# Altium footprint library ThanhNT.PcbLib: 579 footprints (part 27 of 37)
Each footprint in its own frame and in the unit in brackets; x right, y up, seen from the top. Pads: shape width x height; smd on the part's side, far side on the other; paste and mask are expansions set on the pad; w line width, h text height; cw(c..) or ccw(c..) is an arc to the next point about the centre after c.
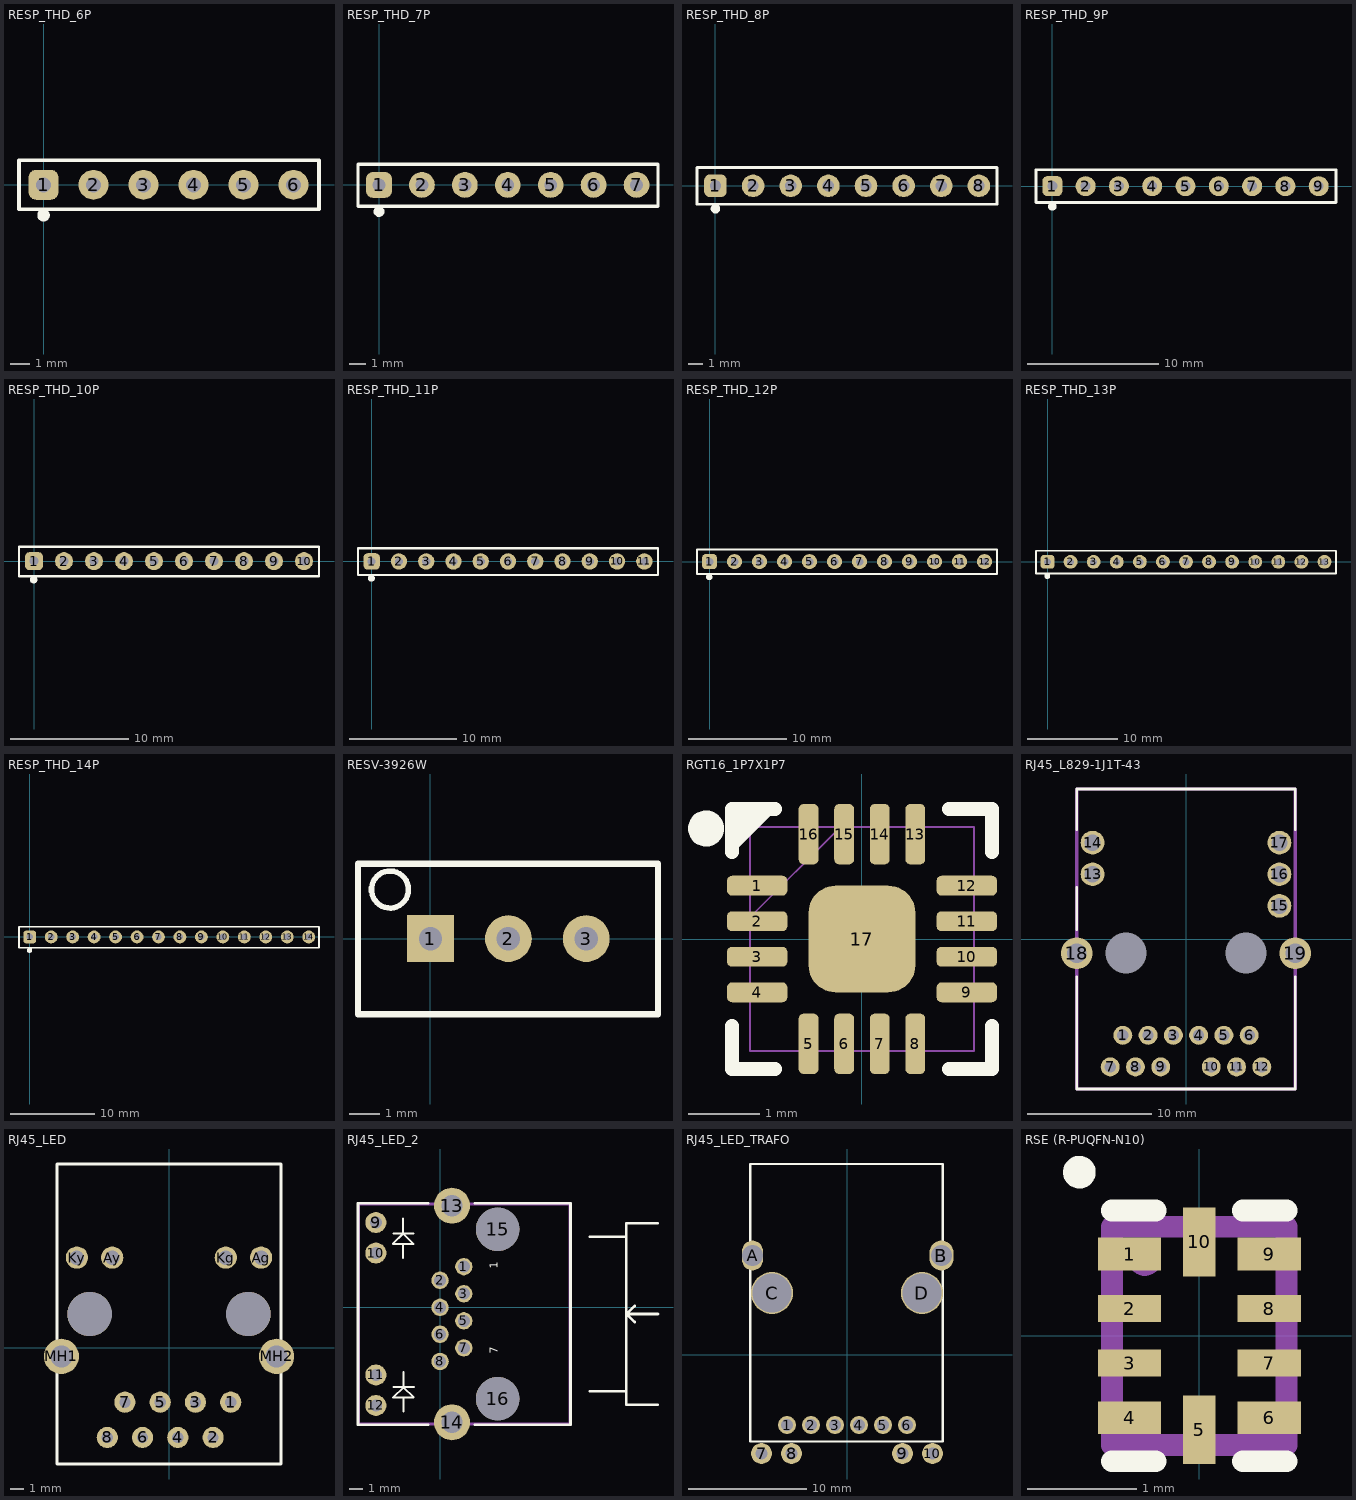
[diagram p26: the footprints below, top view; thin cyan lines are the x and y axes]

## RESP_THD_6P [mil]
pads (6):
  rrect50% 60x60 hole 30: 1(0,0)
  round 60 hole 30: 2(100,0) 3(200,0) 4(300,0) 5(400,0) 6(500,0)
Top Overlay:
  circle w15: c0,-61 r5
  lines w7.87: -49,-49 551,-49 551,49 -49,49 -49,-49
3D body "User Library-4600X Series (Bourns)4606X.STEP": height 206.75, standoff -123.31, extent -49,-52.64 549.03,45.39

## RESP_THD_7P [mil]
pads (7):
  rrect50% 60x60 hole 30: 1(0,0)
  round 60 hole 30: 2(100,0) 3(200,0) 4(300,0) 5(400,0) 6(500,0) 7(600,0)
Top Overlay:
  circle w15: c0,-62 r5
  lines w7.87: -49,-50 650,-50 650,48 -49,48 -49,-50
3D body "User Library-4600X Series (Bourns)4607X.STEP": height 206.75, standoff -123.31, extent -48,-51.64 650.04,46.39

## RESP_THD_8P [mil]
pads (8):
  rrect50% 60x60 hole 30: 1(0,0)
  round 60 hole 30: 2(100,0) 3(200,0) 4(300,0) 5(400,0) 6(500,0) 7(600,0) 8(700,0)
Top Overlay:
  circle w15: c0,-61 r5
  lines w7.87: -49,-49 -49,49 748,49 748,-49 -49,-49
3D body "User Library-4600X Series (Bourns)4608X.STEP": height 206.75, standoff -123.31, extent -49,-51.64 749.04,46.39

## RESP_THD_9P [mil]
pads (9):
  rrect50% 60x60 hole 30: 1(0,0)
  round 60 hole 30: 2(100,0) 3(200,0) 4(300,0) 5(400,0) 6(500,0) 7(600,0) 8(700,0) 9(800,0)
Top Overlay:
  circle w15: c0,-61 r5
  lines w7.87: -49,-49 -49,49 852,49 852,-49 -49,-49
3D body "User Library-4600X Series (Bourns)4609X.STEP": height 206.75, standoff -123.31, extent -49,-50.64 849.04,47.39

## RESP_THD_10P [mil]
pads (10):
  rrect50% 60x60 hole 30: 1(0,0)
  round 60 hole 30: 2(100,0) 3(200,0) 4(300,0) 5(400,0) 6(500,0) 7(600,0) 8(700,0) 9(800,0) 10(900,0)
Top Overlay:
  circle w15: c-1,-62 r5
  lines w7.87: -50,-50 950,-50 950,48 -50,48 -50,-50
3D body "User Library-4600X Series (Bourns)4610X.STEP": height 206.75, standoff -123.31, extent -49,-50.64 949.04,47.39

## RESP_THD_11P [mil]
pads (11):
  rrect50% 60x60 hole 30: 1(0,0)
  round 60 hole 30: 2(100,0) 3(200,0) 4(300,0) 5(400,0) 6(500,0) 7(600,0) 8(700,0) 9(800,0) 10(900,0) 11(1000,0)
Top Overlay:
  circle w15: c-1,-62 r5
  lines w7.87: -50,-50 1050,-50 1050,48 -50,48 -50,-50
3D body "User Library-4600X Series (Bourns)4611X.STEP": height 206.75, standoff -123.31, extent -50,-48.02 1048.03,50.02

## RESP_THD_12P [mil]
pads (12):
  rrect50% 60x60 hole 30: 1(0,0)
  round 60 hole 30: 2(100,0) 3(200,0) 4(300,0) 5(400,0) 6(500,0) 7(600,0) 8(700,0) 9(800,0) 10(900,0) 11(1000,0) 12(1100,0)
Top Overlay:
  circle w15: c-1,-62 r5
  lines w7.87: -50,-50 -50,48 1150,48 1150,-50 -50,-50
3D body "User Library-4600X Series (Bourns)4612X.STEP": height 206.75, standoff -123.31, extent -50.02,-48 1148.02,50.03

## RESP_THD_13P [mil]
pads (13):
  rrect50% 60x60 hole 30: 1(0,0)
  round 60 hole 30: 2(100,0) 3(200,0) 4(300,0) 5(400,0) 6(500,0) 7(600,0) 8(700,0) 9(800,0) 10(900,0) 11(1000,0) 12(1100,0) 13(1200,0)
Top Overlay:
  circle w15: c-1,-62 r5
  lines w7.87: -50,-50 1250,-50 1250,48 -50,48 -50,-50
3D body "User Library-4600X Series (Bourns)4613X.STEP": height 206.75, standoff -123.31, extent -50.02,-50.03 1248.02,48

## RESP_THD_14P [mil]
pads (14):
  rrect50% 60x60 hole 30: 1(0,0)
  round 60 hole 30: 2(100,0) 3(200,0) 4(300,0) 5(400,0) 6(500,0) 7(600,0) 8(700,0) 9(800,0) 10(900,0) 11(1000,0) 12(1100,0) 13(1200,0) 14(1300,0)
Top Overlay:
  circle w15: c-1,-62 r5
  lines w7.87: -50,-50 -50,48 1348,48 1348,-50 -50,-50
3D body "User Library-4600X Series (Bourns)4614X.STEP": height 206.75, standoff -123.31, extent -49.02,-48 1349.02,50.03

## RESV-3926W [mil]
pads (3):
  rect 60x60 hole 30: 1(0,0)
  round 60 hole 30: 2(100,0) 3(200,0)
Top Overlay:
  circle w7.09: c-52,63 r23.77
  lines w7.87: -93,-97 -93,96 292,96 292,-97 -93,-97
3D body "User Library-67W.STEP": height 474.91, standoff -165.64, extent -92.91,-99.44 292.91,95.44

## RGT16_1P7X1P7 [mm]
pads (17):
  rrect50% 0.85x0.28 smd: 1(-1.475,0.75) 2(-1.475,0.25) 3(-1.475,-0.25) 4(-1.475,-0.75) 9(1.475,-0.75) 10(1.475,-0.25) 11(1.475,0.25) 12(1.475,0.75)
  rrect50% 0.28x0.85 smd: 5(-0.75,-1.475) 6(-0.25,-1.475) 7(0.25,-1.475) 8(0.75,-1.475) 13(0.75,1.475) 14(0.25,1.475) 15(-0.25,1.475) 16(-0.75,1.475)
  rrect50% 1.5x1.5 smd: 17(0,0)
Top Overlay:
  circle w0.254: c-2.194,1.555 r0.127
  region: -1.854,1.803 -1.219,1.803 -1.854,1.168
  lines w0.2: -1.829,-1.223 -1.829,-1.829 -1.223,-1.829 ; -1.829,1.223 -1.829,1.829 -1.223,1.829 ; 1.223,-1.829 1.829,-1.829 1.829,-1.223 ; 1.223,1.829 1.829,1.829 1.829,1.223
Mechanical 1:
  lines w0.025: -1.575,0.305 -0.305,1.575 ; -1.575,-1.575 -1.575,1.575 1.575,1.575 1.575,-1.575 -1.575,-1.575 ; -1.575,-0.9 -1.575,-0.6 -1.575,-0.9 ; -1.575,-0.4 -1.575,-0.1 -1.575,-0.4 ; -1.575,0.1 -1.575,0.4 -1.575,0.1 ; -1.575,0.6 -1.575,0.9 -1.575,0.6 ; -0.9,-1.575 -0.6,-1.575 -0.9,-1.575 ; -0.9,1.575 -0.6,1.575 -0.9,1.575 ; -0.4,-1.575 -0.1,-1.575 -0.4,-1.575 ; -0.4,1.575 -0.1,1.575 -0.4,1.575 ; 0.1,-1.575 0.4,-1.575 0.1,-1.575 ; 0.1,1.575 0.4,1.575 0.1,1.575 ; 0.6,-1.575 0.9,-1.575 0.6,-1.575 ; 0.6,1.575 0.9,1.575 0.6,1.575 ; 1.575,-0.9 1.575,-0.6 1.575,-0.9 ; 1.575,-0.4 1.575,-0.1 1.575,-0.4 ; 1.575,0.1 1.575,0.4 1.575,0.1 ; 1.575,0.6 1.575,0.9 1.575,0.6
3D body "User Library-QFN16-1.STEP": height 0.9, standoff 0.01, extent -1.55,-1.55 1.55,1.55

## RJ45_L829-1J1T-43 [mil]
pads (21):
  round 60 hole 35.43: 1(-200,-305) 2(-120,-305) 3(-40,-305) 4(40,-305) 5(120,-305) 6(200,-305) 7(-240,-405) 8(-160,-405) 9(-80,-405) 10(80,-405) 11(160,-405) 12(240,-405)
  round 75 hole 51.18: 13(-296,205) 14(-296,305) 15(296,105) 16(296,205) 17(296,305)
  round 100 hole 63: 18(-346,-45) 19(346,-45)
  round 0 hole 129.92: ""(-190,-45) ""(190,-45)
Top Overlay:
  lines w8: -346,-120 -346,-475 346,-475 346,-120 ; -346,30 -346,164 ; -346,346 -346,475 346,475 346,346
Mechanical 16:
  lines w10: -346,-475 346,-475 346,475 -346,475 -346,-475
3D body "l829-1j1t-43.stp": height 493.65, standoff -150.89, extent -400.54,-471.86 400.54,494.49

## RJ45_LED [mm] "RJ-45 Cat5, 90° with green and yellow LED"
height 13.5
pads (16):
  round 1.524 hole 0.813: 1(4.445,-3.935) 2(3.175,-6.475) 3(1.905,-3.935) 4(0.635,-6.475) 5(-0.635,-3.935) 6(-1.905,-6.475) 7(-3.175,-3.935) 8(-4.445,-6.475)
  round 1.6 hole 1.05: Ag(6.63,6.475) Ay(-4.09,6.475) Kg(4.09,6.475) Ky(-6.63,6.475)
  round 2.54 hole 1.6: MH1(-7.745,-0.635) MH2(7.745,-0.635)
  round 3.2 hole 3.2 unplated: ""(-5.715,2.415) ""(5.715,2.415)
Top Overlay:
  lines w0.2: -8.07,-8.385 8.07,-8.385 8.07,13.215 -8.07,13.215 -8.07,-8.385
3D body "RJ-45_LED.stp": height 14.72, standoff -3.94, extent -7.932,-8.385 8.07,12.951

## RJ45_LED_2 [mm]
pads (16):
  round 1.3 hole 0.9: 1(1.78,3.05) 2(0,2.03) 3(1.78,1.02) 4(0,0) 5(1.78,-1.01) 6(0,-2.02) 7(1.78,-3.04) 8(0,-4.06)
  round 1.575 hole 0.9: 9(-4.82,6.36) 10(-4.82,4.07) 11(-4.82,-5.07) 12(-4.82,-7.36)
  round 2.7 hole 1.6: 13(0.89,7.63) 14(0.89,-8.63)
  round 3.25 hole 3.25 unplated: 15(4.32,5.85) 16(4.32,-6.85)
Top Overlay:
  lines w0.15: -3.51,5.54 -1.99,5.54 ; -3.49,-5.98 -1.97,-5.98 ; -2.78,3.72 -2.78,4.76 ; -2.78,6.65 -2.78,5.53 -2.01,4.76 -3.54,4.76 -2.76,5.54 ; -2.76,-7.8 -2.76,-6.76 ; -2.76,-4.87 -2.76,-5.99 -1.99,-6.76 -3.52,-6.76 -2.74,-5.98
  lines w0.2: -0.91,-8.8 -6.16,-8.8 -6.16,7.8 -0.91,7.8 ; 2.61,-8.8 9.78,-8.8 9.78,7.8 2.61,7.8 ; 11.25,-6.3 13.98,-6.3 ; 11.25,5.3 13.98,5.3 ; 14.6,-1.1 14,-0.5 ; 14.6,0.1 14,-0.5 ; 16.33,-7.3 13.98,-7.3 13.98,6.3 16.33,6.3 ; 16.35,-0.5 14,-0.5
  text "7" at 4.33,-3.5 h0.6
  text "1" at 4.33,2.9 h0.6
Mechanical 16:
  lines w0.254: -6.12,-8.75 9.68,-8.75 9.78,-8.65 9.78,7.75 -6.12,7.75 -6.12,-8.75
3D body "c-2-406549-1-r4-3d.stp": height 14.8, standoff -3.92, extent -6.15,-9.8 10.571,8.828

## RJ45_LED_TRAFO [mil]
pads (14):
  round 60 hole 40: 1(-200,-235) 2(-120,-235) 3(-40,-235) 4(40,-235) 5(120,-235) 6(200,-235)
  round 70 hole 40: 7(-285,-330) 8(-185,-330) 9(185,-330) 10(285,-330)
  oval 70x100 hole 70: A(-315,330)
  oval 80x100 hole 70: B(315,330)
  round 140 hole 130: C(-250,205) D(250,205)
Top Overlay:
  lines w7.87: -322.05,-290.12 -322.05,635.08 319.69,635.08 319.69,-290.12 -322.05,-290.12
3D body: height 527.56, standoff 0, extent -327.05,-360 324.69,635

## RSE (R-PUQFN-N10) [mm]
pads (10):
  rect 0.58x0.3 smd mask+0.03: 1(-0.64,0.75) 4(-0.64,-0.75) 6(0.64,-0.75) 9(0.64,0.75)
  rect 0.58x0.25 smd mask+0.03: 2(-0.64,0.25) 3(-0.64,-0.25) 7(0.64,-0.25) 8(0.64,0.25)
  rect 0.3x0.63 smd mask+0.03: 5(0,-0.86) 10(0,0.86)
Top Overlay:
  circle w0.15: c-1.1,1.5 r0.075
  lines w0.2: -0.8,-1.15 -0.4,-1.15 ; -0.8,1.15 -0.4,1.15 ; 0.4,-1.15 0.8,-1.15 ; 0.4,1.15 0.8,1.15
Mechanical 16:
  circle w0.15: c-0.5,0.7 r0.075
  lines w0.2: -0.8,-1 0.8,-1 0.8,1 -0.8,1 -0.8,-1
3D body: height 0.6, standoff 0, extent -0.75,-1 0.75,1